# Altium footprint library CONN_TBLOCK_3P5_B.PcbLib: 36 footprints (part 3 of 3)
Each footprint in its own frame and in the unit in brackets; x right, y up, seen from the top. Pads: shape width x height; smd on the part's side, far side on the other; paste and mask are expansions set on the pad; w line width, h text height; cw(c..) or ccw(c..) is an arc to the next point about the centre after c.
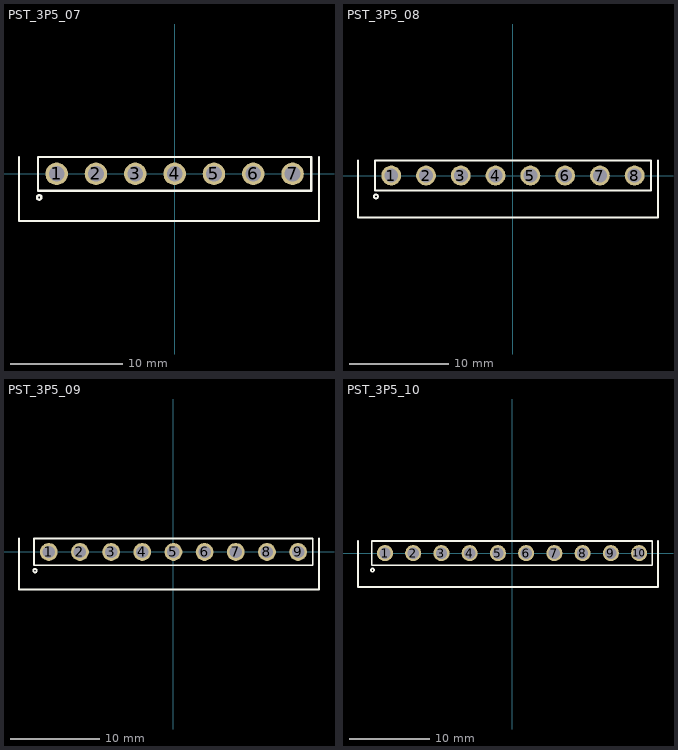
[diagram p2: the footprints below, top view; thin cyan lines are the x and y axes]

## PST_3P5_07 [mm] "Terminal pin strip, Pitch 3.5mm, PST 1,0/ x-3,5"
height 9.2
pads (7):
  round 2 / inner round 2 / far side rect 2.5x3 hole 1.4: 1(-10.5,0)
  round 2 / inner round 2 / far side oval 2.5x3 hole 1.4: 2(-7,0) 3(-3.5,0) 4(0,0) 5(3.5,0) 6(7,0) 7(10.5,0)
Top Overlay:
  circle w0.2: c-12.05,-2.1 r0.2
  lines w0.2: -13.85,1.5 -13.85,-4.2 12.85,-4.2 12.85,1.5 ; -12.15,-1.5 12.15,-1.5 12.15,1.5 -12.15,1.5 -12.15,-1.5
3D body "PST-1-0-2-3-5.stp": height 9.1, standoff -3.9, extent 5.452,-1.4 12.052,1.4
3D body "PST-1-0-3-3-5.stp": height 9.1, standoff -3.9, extent -5.048,-1.4 5.052,1.4
3D body "PST-1-0-2-3-5.stp": height 9.1, standoff -3.9, extent -12.048,-1.4 -5.448,1.4

## PST_3P5_08 [mm] "Terminal pin strip, Pitch 3.5mm, PST 1,0/ x-3,5"
height 9.2
pads (8):
  round 2 / inner round 2 / far side rect 2.5x3 hole 1.4: 1(-12.25,0)
  round 2 / inner round 2 / far side oval 2.5x3 hole 1.4: 2(-8.75,0) 3(-5.25,0) 4(-1.75,0) 5(1.75,0) 6(5.25,0) 7(8.75,0) 8(12.25,0)
Top Overlay:
  circle w0.2: c-13.8,-2.1 r0.2
  lines w0.2: -15.6,1.5 -15.6,-4.2 14.6,-4.2 14.6,1.5 ; -13.9,-1.5 -13.9,1.5 13.9,1.5 13.9,-1.5 -13.9,-1.5
3D body "PST-1-0-2-3-5.stp": height 9.1, standoff -3.9, extent -13.798,-1.4 -7.198,1.4
3D body "PST-1-0-3-3-5.stp": height 9.1, standoff -3.9, extent -6.798,-1.4 3.302,1.4
3D body "PST-1-0-3-3-5.stp": height 9.1, standoff -3.9, extent 3.702,-1.4 13.802,1.4

## PST_3P5_09 [mm] "Terminal pin strip, Pitch 3.5mm, PST 1,0/ x-3,5"
height 9.2
pads (9):
  round 2 / inner round 2 / far side rect 2.5x3 hole 1.4: 1(-14,0)
  round 2 / inner round 2 / far side oval 2.5x3 hole 1.4: 2(-10.5,0) 3(-7,0) 4(-3.5,0) 5(0,0) 6(3.5,0) 7(7,0) 8(10.5,0) 9(14,0)
Top Overlay:
  circle w0.2: c-15.55,-2.1 r0.2
  lines w0.2: -17.35,1.5 -17.35,-4.2 16.35,-4.2 16.35,1.5 ; -15.65,-1.5 15.65,-1.5 15.65,1.5 -15.65,1.5 -15.65,-1.5
3D body "PST-1-0-3-3-5.stp": height 9.1, standoff -3.9, extent 5.452,-1.4 15.552,1.4
3D body "PST-1-0-3-3-5.stp": height 9.1, standoff -3.9, extent -5.048,-1.4 5.052,1.4
3D body "PST-1-0-3-3-5.stp": height 9.1, standoff -3.9, extent -15.548,-1.4 -5.448,1.4

## PST_3P5_10 [mm] "Terminal pin strip, Pitch 3.5mm, PST 1,0/ x-3,5"
height 9.2
pads (10):
  round 2 / inner round 2 / far side rect 2.5x3 hole 1.4: 1(-15.75,0)
  round 2 / inner round 2 / far side oval 2.5x3 hole 1.4: 2(-12.25,0) 3(-8.75,0) 4(-5.25,0) 5(-1.75,0) 6(1.75,0) 7(5.25,0) 8(8.75,0) 9(12.25,0) 10(15.75,0)
Top Overlay:
  circle w0.2: c-17.3,-2.1 r0.2
  lines w0.2: -19.1,1.5 -19.1,-4.2 18.1,-4.2 18.1,1.5 ; -17.4,-1.5 17.4,-1.5 17.4,1.5 -17.4,1.5 -17.4,-1.5
3D body "PST-1-0-3-3-5.stp": height 9.1, standoff -3.9, extent 7.202,-1.4 17.302,1.4
3D body "PST-1-0-2-3-5.stp": height 9.1, standoff -3.9, extent 0.202,-1.4 6.802,1.4
3D body "PST-1-0-3-3-5.stp": height 9.1, standoff -3.9, extent -10.298,-1.4 -0.198,1.4
3D body "PST-1-0-2-3-5.stp": height 9.1, standoff -3.9, extent -17.298,-1.4 -10.698,1.4